# Altium footprint library Lib_001.PcbLib: 429 footprints (part 11 of 28)
Each footprint in its own frame and in the unit in brackets; x right, y up, seen from the top. Pads: shape width x height; smd on the part's side, far side on the other; paste and mask are expansions set on the pad; w line width, h text height; cw(c..) or ccw(c..) is an arc to the next point about the centre after c.
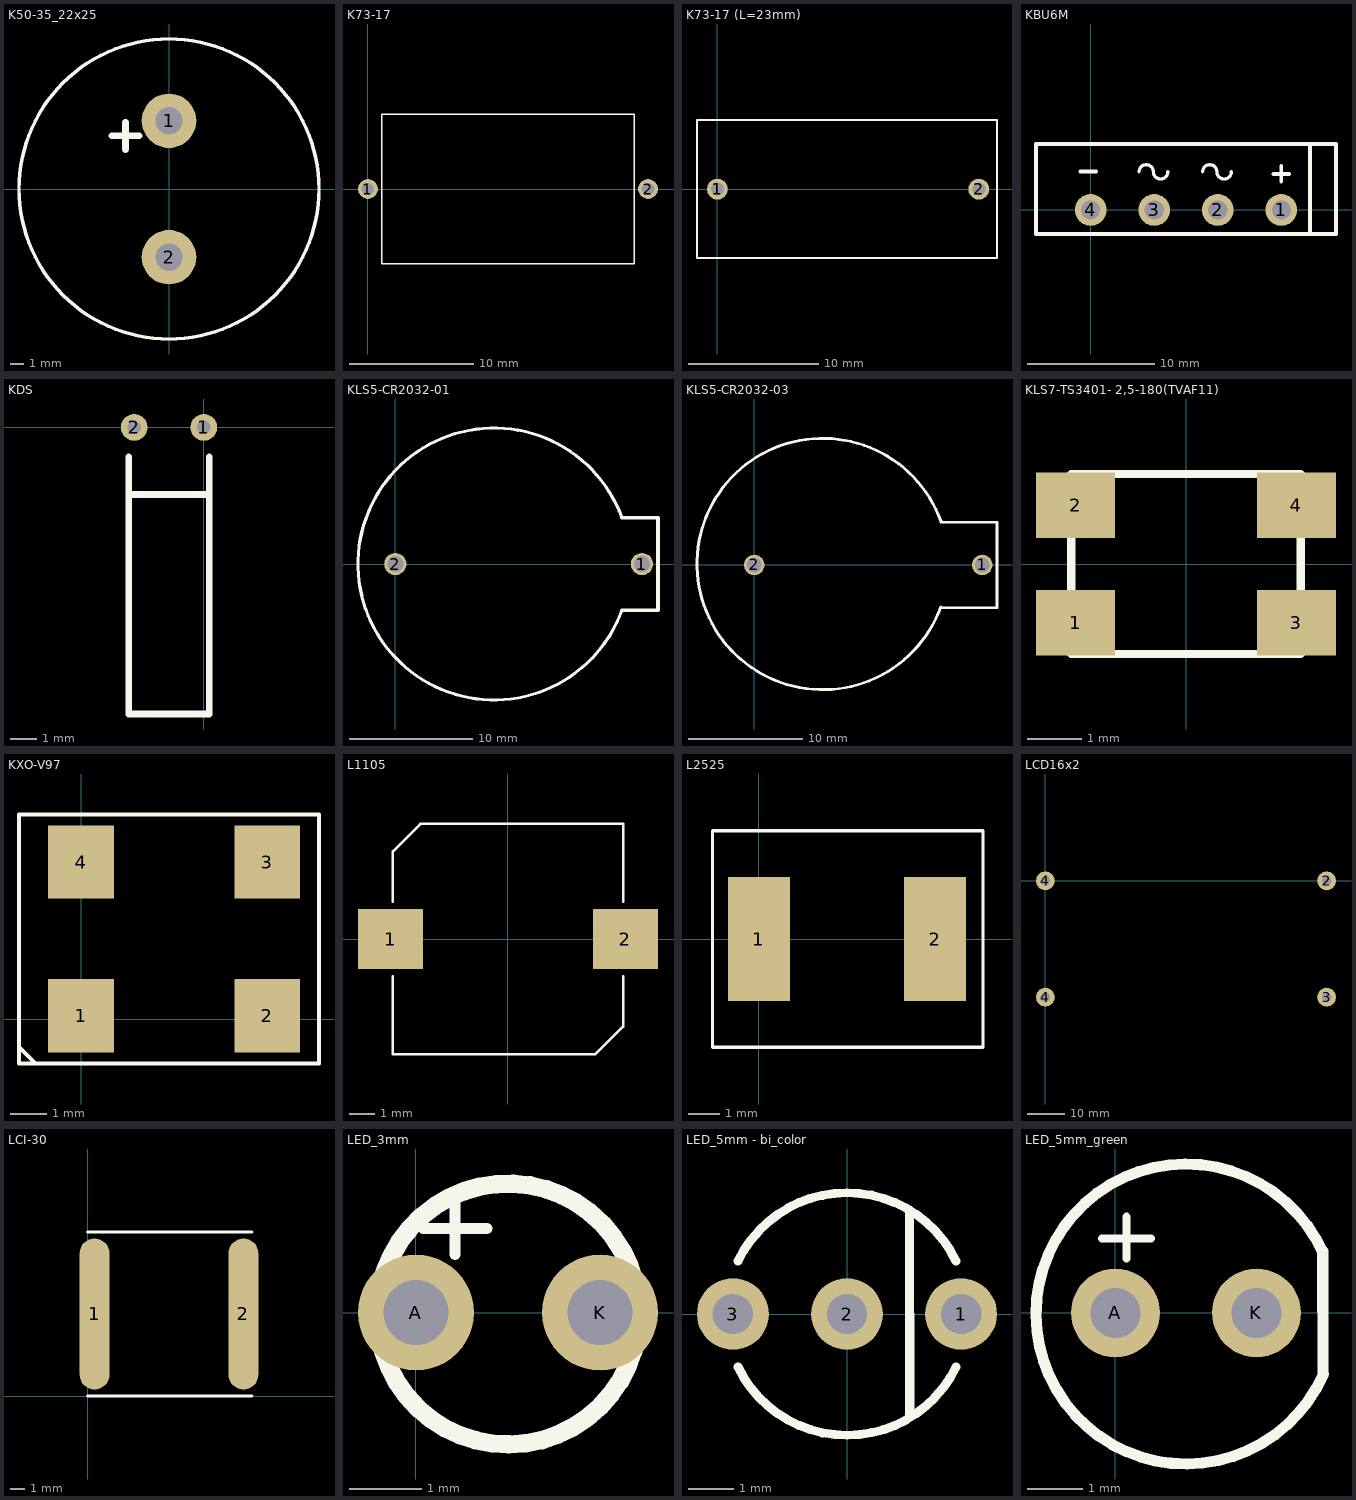
[diagram p10: the footprints below, top view; thin cyan lines are the x and y axes]

## K50-35_22x25 [mm]
height 25
pads (2):
  round 4 hole 2 unplated: 1(0,5) 2(0,-5)
Top Overlay:
  circle w0.254: c0,0 r11
  lines w0.5: -4.18,3.9 -2.18,3.9 ; -3.18,2.9 -3.18,4.9
3D body "User Library-ECEC2DP271BJ.STEP": height 25, standoff 0, extent -11,-11 11,11

## K73-17 [mm]
pads (2):
  round 1.6 hole 1: 1(-0.001,-0.001) 2(22.5,0)
Top Overlay:
  lines w0.15: 1.11,6.001 1.11,0 1.11,-6.001 21.388,-6.001 ; 1.111,6.002 21.389,6.002 21.389,0.001 21.389,-6

## K73-17 (L=23mm) [mm]
pads (2):
  round 1.6 hole 1: 1(-0.001,-0.001) 2(20,0)
Top Overlay:
  lines w0.15: -1.559,-5.252 21.389,-5.252 21.389,0.001 21.389,5.274 -1.559,5.274 -1.559,-0.001 -1.559,-5.252
3D body: height 9, standoff -1, extent 19.603,-0.399 20.4,0.399
3D body: height 9, standoff -1, extent -0.398,-0.4 0.399,0.398
3D body: height 21, standoff 0, extent -1.559,-5.252 21.389,5.274

## KBU6M [mm] "Single-Phase Bridge Rectifier"
pads (4):
  round 2.5 hole 1.5: 1(15,0) 2(10,0) 3(5,0) 4(0,0)
Top Overlay:
  lines w0.254: 3.803,3 cw(c4.369,3) 4.934,3 ccw(c5.5,3) 6.066,3 ; 8.803,3 cw(c9.369,3) 9.934,3 ccw(c10.5,3) 11.066,3
  lines w0.3: -4.3,-1.9 19.3,-1.9 ; -4.3,-1.87 -4.3,3.3 -4.3,5.18 ; -4.3,5.2 19.3,5.2 ; -0.825,3.02 0.425,3.02 ; 14.37,2.84 15.62,2.84 ; 14.995,2.215 14.995,3.465 ; 17.26,-1.84 17.26,5.2 ; 19.3,-1.87 19.3,3.3 19.3,5.18
3D body "User Library-Silicon Bridge Rectifiers KBU6J.step": height 33.65, standoff -11.65, extent -4.1,-2.45 19.1,4.5

## KDS [mm]
pads (2):
  round 1 hole 0.5: 1(0,0) 2(-2.6,0)
Top Overlay:
  lines w0.254: -2.8,-1.1 -2.8,-2.5 ; 0.2,-1.1 0.2,-2.5 ; -2.8,-2.5 -2.8,-10.7 0.2,-10.7 0.2,-2.5 ; -2.8,-2.5 0.2,-2.5
3D body "User Library-DT-38.STEP": height -1.05, standoff -4.5, extent -2.8,-10.8 0.2,0.216

## KLS5-CR2032-01 [mm]
pads (2):
  round 1.8 hole 1.3 unplated: 1(20,0) 2(0,0)
Top Overlay:
  lines w0.254: 18.367,-3.754 cw(c8,0.003) 18.372,3.746
  lines w0.3: 18.368,-3.754 21.3,-3.754 ; 18.372,3.746 21.3,3.746 21.3,0.003 21.3,-3.741
3D body "User Library-CR2032_HOR_HOLD.step": height 8.6, standoff -3.9, extent -3.093,-11.054 21.408,10.946

## KLS5-CR2032-03 [mm]
pads (2):
  round 1.8 hole 1.3 unplated: 1(20,0) 2(0,0)
Top Overlay:
  lines w0.254: 16.325,-3.754 21.3,-3.754 ; 16.376,-3.673 cw(c6.009,0.084) 16.381,3.827 ; 16.381,3.746 21.3,3.746 21.3,0.003 21.3,-3.741
3D body "User Library-CH25-2032.step": height 8.5, standoff -2.9, extent -5.212,-11.397 22.288,11.402

## KLS7-TS3401- 2,5-180(TVAF11) [mm]
pads (4):
  rect 1.45x1.2 smd: 1(-2.022,-1.075) 2(-2.022,1.075) 3(2.021,-1.075) 4(2.021,1.075)
Top Overlay:
  lines w0.15: -2.1,-1.65 -2.1,1.65 2.1,1.65 2.1,-1.65 -2.1,-1.65

## KXO-V97 [mm]
pads (4):
  rect 1.8x2 smd: 1(0,0.1) 2(5.08,0.1) 3(5.08,4.3) 4(0,4.3)
Top Overlay:
  lines w0.102: -1.698,-0.75 -1.25,-1.199 ; -1.698,-1.199 6.494,-1.199 6.494,5.595 -1.299,5.595 -1.698,5.595 -1.698,-1.199
3D body "User Library-KXO-97V.step": height 1.3, standoff 0, extent -0.98,-0.262 6.02,4.818

## L1105 [mm] "Bourns inductor 1105"
pads (2):
  rect 2.6x2.4 smd: 1(-4.7,0) 2(4.7,0)
Top Overlay:
  lines w0.1: -4.6,-1.5 -4.6,-4.6 3.5,-4.6 4.6,-3.5 4.6,-1.5 ; -4.6,1.5 -4.6,3.5 -3.5,4.6 4.6,4.6 4.6,1.5

## L2525 [mm]
pads (2):
  rect 2x4 smd: 1(0,0) 2(5.7,0)
Top Overlay:
  lines w0.1: -1.5,-3.5 7.25,-3.5 7.25,3.5 -1.5,3.5 -1.5,-3.5
3D body "User Library-Murata_4600.step": height 4.55, standoff 0, extent -0.814,-3.74 6.614,3.56

## LCD16x2 [mm]
pads (4):
  round 5 hole 2.5: 2(75,0) 3(75,-31) 4(0,-31) 4(0,0)
3D body "SW3dPS-LCD module 16 X 2 backlight.STEP": height 10.52, standoff -2.69, extent -2.75,-33.75 77.75,2.75

## LCI-30 [mm] "Inductor LCI-30 SERIES"
pads (2):
  oval 2x10.16 smd: 1(0.472,5.525) 2(10.476,5.525)
Top Overlay:
  lines w0.2: 0,0 11.05,0 ; 0,11.05 11.05,11.05
3D body "LCI-30.stp": height 8.17, standoff -0.08, extent -0.315,0.05 11.365,11

## LED_3mm [mm]
pads (2):
  round 1.6 hole 0.9: A(0,0) K(2.54,0)
Top Overlay:
  lines w0.15: 0.1,1.16 0.98,1.16 ; 0.54,0.8 0.54,1.55
  lines w0.254: 3.07,-0.085 cw(c1.271,-0.02) 3.071,-0.02
3D body "SW3dPS-LEDd3G.STEP": height 7.01, standoff -0.99, extent -0.4,-1.694 2.9,1.594

## LED_5mm - bi_color [mm]
height 10
pads (3):
  round 1.6 hole 0.9: 1(2.54,0) 2(0,0) 3(-2.54,0)
Top Overlay:
  lines w0.2: -2.43,1.176 cw(c0,0) 2.429,1.179 ; -2.429,-1.179 ccw(c0,0) 2.43,-1.176
  lines w0.203: 1.395,2.311 1.397,-2.261
3D body "User Library-5mmBiColorLED.step": height 11.61, standoff -1.83, extent -2.946,-2.946 2.794,2.946

## LED_5mm_green [mm]
height 20
pads (2):
  round 1.6 hole 0.9: A(0,0) K(2.54,0)
Top Overlay:
  lines w0.15: -0.24,1.34 0.64,1.34 ; 0.2,0.98 0.2,1.73
  lines w0.2: 3.729,1.097 ccw(c1.271,-0.02) 3.745,-1.104
  lines w0.203: 3.735,1.111 3.736,-1.1
3D body "SW3dPS-LEDd5G.STEP": height 12.31, standoff -2.49, extent -1.71,-3.01 3.71,3.01